# Altium footprint library can.PcbLib: 70 footprints (part 3 of 5)
Each footprint in its own frame and in the unit in brackets; x right, y up, seen from the top. Pads: shape width x height; smd on the part's side, far side on the other; paste and mask are expansions set on the pad; w line width, h text height; cw(c..) or ccw(c..) is an arc to the next point about the centre after c.
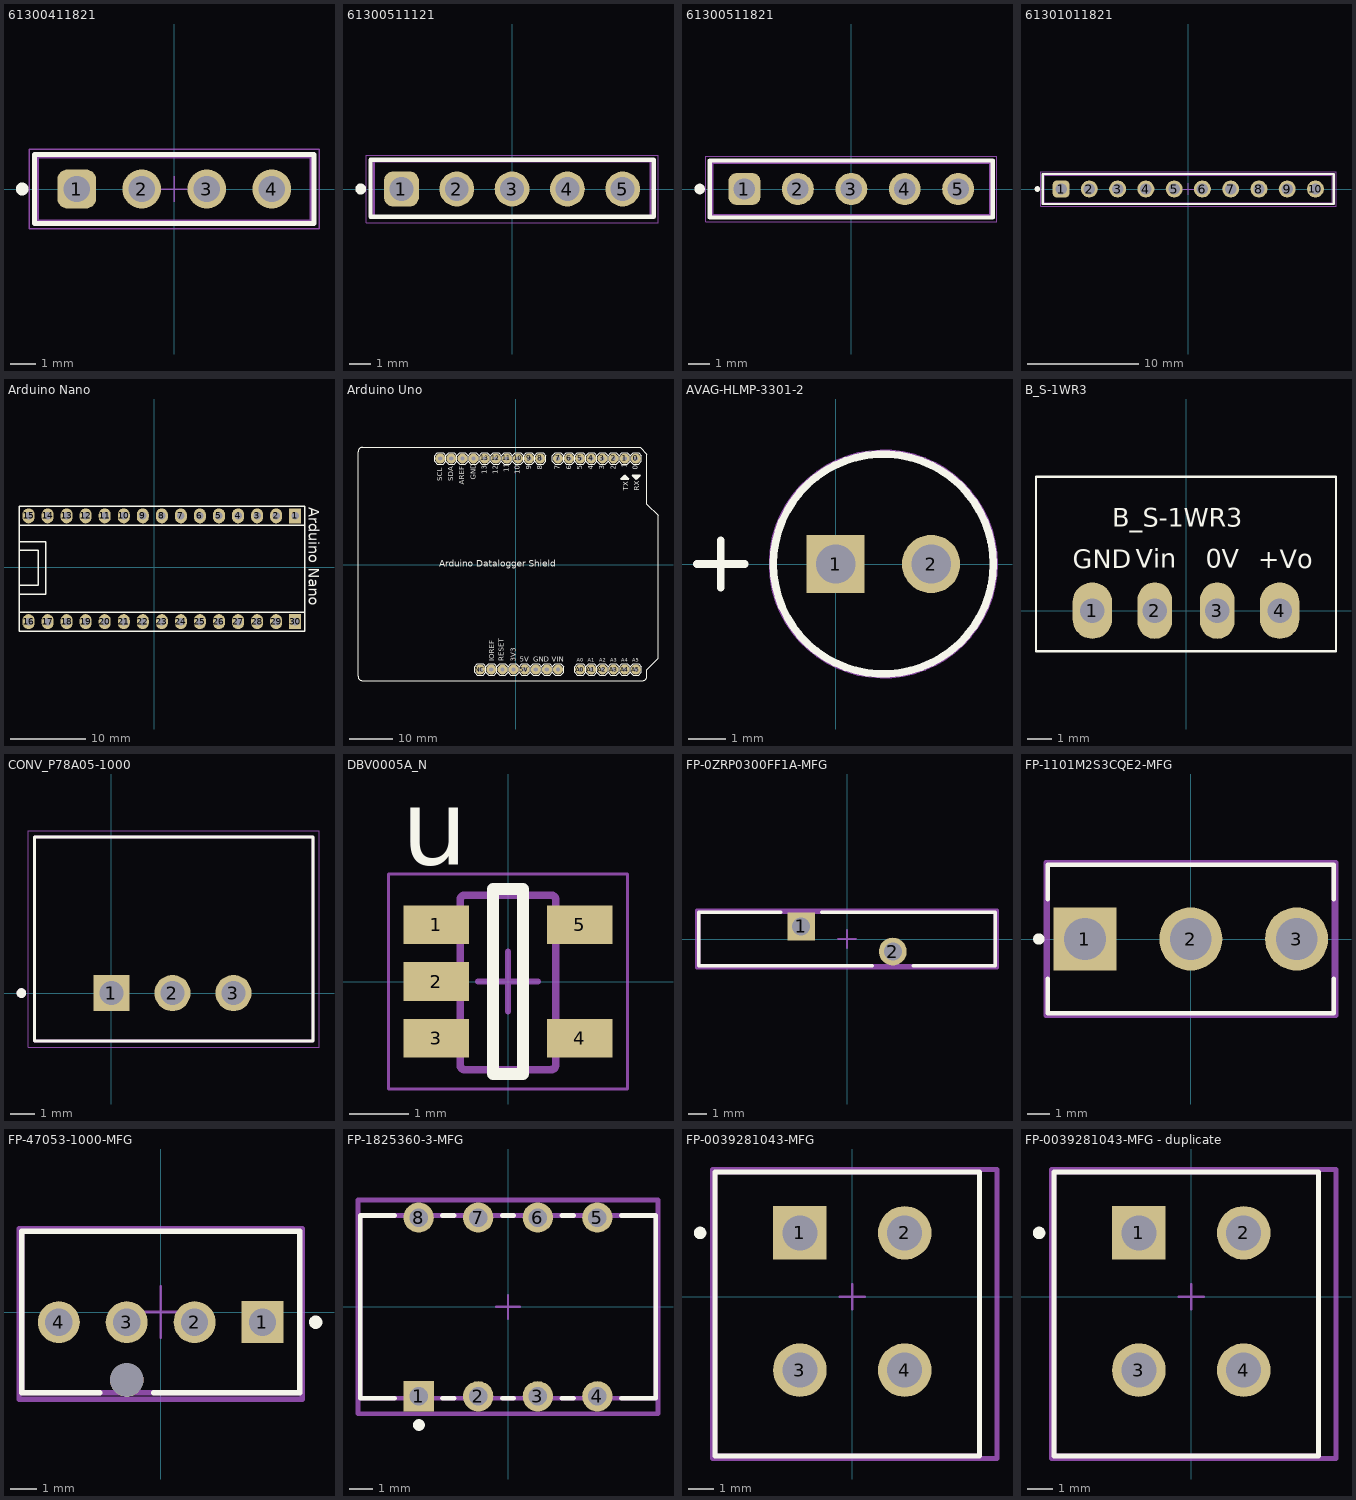
[diagram p2: the footprints below, top view; thin cyan lines are the x and y axes]

## 61300411821 [mm] "Socket Header, Pitch 2.54 mm, THT, Vertical, single row, 4p"
height 8.5
pads (4):
  rrect50% 1.52x1.52 hole 1.02: 1(-3.81,0)
  round 1.52 hole 1.02: 2(-1.27,0) 3(1.27,0) 4(3.81,0)
Top Overlay:
  circle w0.25: c-5.94,0 r0.125
  lines w0.2: -5.455,-1.35 -5.455,1.35 5.455,1.35 5.455,-1.35 -5.455,-1.35
Top Courtyard:
  lines w0.05: -5.655,-1.55 -5.655,1.55 5.655,1.55 5.655,-1.55 -5.655,-1.55
Top Designator:
  text ".Designator" at -7.498,-0.5 h1.5
Top Component Outline:
  lines w0.1: -5.33,-1.25 -5.33,1.25 5.33,1.25 5.33,-1.25 -5.33,-1.25
Top Component Center:
  lines w0.05: -0.5,0 0.5,0 ; 0,-0.5 0,0.5
3D body "61300411821.stp": height 8.55, standoff -3.05, extent -5.33,-1.25 5.33,1.25

## 61300511121 [mm] "Pin Header, pitch 2.54 mm, THT, Vertical, single row, 5p"
height 8.54
pads (5):
  rrect50% 1.6x1.6 hole 1.1: 1(-5.08,0)
  round 1.6 hole 1.1: 2(-2.54,0) 3(0,0) 4(2.54,0) 5(5.08,0)
Top Overlay:
  circle w0.25: c-6.95,0 r0.125
  lines w0.2: -6.5,-1.27 -6.5,1.345 6.5,1.345 6.5,-1.27 -6.5,-1.27
Top Courtyard:
  lines w0.05: -6.7,-1.545 -6.7,1.545 6.7,1.545 6.7,-1.545 -6.7,-1.545
Top Designator:
  text ".Designator" at -7.498,-0.5 h1.5
Top Component Outline:
  lines w0.1: -6.35,-1.27 6.35,-1.27 6.35,1.27 -6.35,1.27 -6.35,-1.27
Top Component Center:
  lines w0.05: -0.5,0 0.5,0 ; 0,-0.5 0,0.5
3D body "61300511121.stp": height 8.57, standoff -2.97, extent -6.35,-1.27 6.35,1.27

## 61300511821 [mm] "Socket Header, Pitch 2.54 mm, THT, Vertical, single row, 5p"
height 8.5
pads (5):
  rrect50% 1.52x1.52 hole 1.02: 1(-5.08,0)
  round 1.52 hole 1.02: 2(-2.54,0) 3(0,0) 4(2.54,0) 5(5.08,0)
Top Overlay:
  circle w0.25: c-7.21,0 r0.125
  lines w0.2: -6.725,-1.35 6.725,-1.35 6.725,1.35 -6.725,1.35 -6.725,-1.35
Top Courtyard:
  lines w0.05: -6.925,-1.55 6.925,-1.55 6.925,1.55 -6.925,1.55 -6.925,-1.55
Top Designator:
  text ".Designator" at -7.498,-0.5 h1.5
Top Component Outline:
  lines w0.1: -6.6,-1.25 6.6,-1.25 6.6,1.25 -6.6,1.25 -6.6,-1.25
Top Component Center:
  lines w0.05: -0.5,0 0.5,0 ; 0,-0.5 0,0.5
3D body "61300511821.stp": height 8.55, standoff -3.06, extent -6.6,-1.25 6.6,1.25

## 61301011821 [mm] "Socket Header, Pitch 2.54 mm, THT, Vertical, single row, 10p"
height 8.5
pads (10):
  rrect50% 1.52x1.52 hole 1.02: 1(-11.43,0)
  round 1.52 hole 1.02: 2(-8.89,0) 3(-6.35,0) 4(-3.81,0) 5(-1.27,0) 6(1.27,0) 7(3.81,0) 8(6.35,0) 9(8.89,0) 10(11.43,0)
Top Overlay:
  circle w0.25: c-13.56,0 r0.125
  lines w0.2: -13.075,-1.35 -13.075,1.35 13.075,1.35 13.075,-1.35 -13.075,-1.35
Top Courtyard:
  lines w0.05: -13.275,-1.55 -13.275,1.55 13.275,1.55 13.275,-1.55 -13.275,-1.55
Top Designator:
  text ".Designator" at -7.498,-0.5 h1.5
Top Component Outline:
  lines w0.1: -12.95,-1.25 -12.95,1.25 12.95,1.25 12.95,-1.25 -12.95,-1.25
Top Component Center:
  lines w0.05: -0.5,0 0.5,0 ; 0,-0.5 0,0.5
3D body "61301011821.stp": height 8.55, standoff -3.06, extent -12.95,-1.25 12.95,1.25

## Arduino Nano [mm]
pads (30):
  rect 1.6x2 hole 1: 1(18.796,6.858) 30(18.796,-7.239)
  oval 1.6x2 hole 1: 2(16.256,6.858) 3(13.716,6.858) 4(11.176,6.858) 5(8.636,6.858) 6(6.096,6.858) 7(3.556,6.858) 8(1.016,6.858) 9(-1.524,6.858) 10(-4.064,6.858) 11(-6.604,6.858) 12(-9.144,6.858) 13(-11.684,6.858) 14(-14.224,6.858) 15(-16.764,6.858) 16(-16.764,-7.239) 17(-14.224,-7.239) 18(-11.684,-7.239) 19(-9.144,-7.239) 20(-6.604,-7.239) 21(-4.064,-7.239) 22(-1.524,-7.239) 23(1.016,-7.239) 24(3.556,-7.239) 25(6.096,-7.239) 26(8.636,-7.239) 27(11.176,-7.239) 28(13.716,-7.239) 29(16.256,-7.239)
Top Overlay:
  lines w0.2: -18.034,-7.493 -18.034,6.858 ; -18.034,-3.429 -18.034,-3.556 -14.478,-3.556 -14.478,3.429 -18.034,3.429 ; -18.034,-2.413 -15.494,-2.413 -15.494,2.286 -18.034,2.286 ; 20.066,-8.128 20.066,8.001 ; -18.034,-8.509 18.161,-8.509 20.066,-8.509 20.066,-5.969 -18.034,-5.969 -18.034,-8.509 ; -18.034,5.588 18.161,5.588 20.066,5.588 20.066,8.128 -18.034,8.128 -18.034,5.588
  text "Arduino Nano" at 20.574,8.001 h1.4

## Arduino Uno [mm]
pads (32):
  round 2.3 hole 1: 0(27.44,24.26) 1(24.9,24.26) 2(22.36,24.26) 3(19.82,24.26) 3.3V(-0.5,-24) 4(17.28,24.26) 5(14.74,24.26) 5V(2.04,-24) 6(12.2,24.26) 7(9.66,24.26) 8(5.596,24.26) 9(3.056,24.26) 10(0.516,24.26) 11(-2.024,24.26) 12(-4.564,24.26) 13(-7.104,24.26) A0(14.74,-24) A1(17.28,-24) A2(19.82,-24) A3(22.36,-24) A4(24.9,-24) A5(27.44,-24) AREF(-12.184,24.26) GND1(7.12,-24) GND2(4.58,-24) GND3(-9.644,24.26) IOREF(-5.58,-24) NC(-8.12,-24) RST(-3.04,-24) SCL(-17.264,24.26) SDA(-14.724,24.26) Vin(9.66,-24)
Top Overlay:
  drawing of 255 lines, arcs and shapes, not listed
  text "Arduino Datalogger Shield" at -17.5,-0.5 h1.52
  text "SDA" at -14.271,19.087 h1.21
  text "SCL" at -16.8,19.1 h1.21
  text "0" at 27.887,21.676 h1.21
  text "1" at 25.347,22.079 h1.21
  text "2" at 22.807,21.676 h1.21
  text "3" at 20.267,21.676 h1.21
  text "4" at 17.727,21.676 h1.21
  text "5" at 15.187,21.676 h1.21
  text "6" at 12.647,21.676 h1.21
  text "7" at 10.107,21.676 h1.21
  text "8" at 6.043,21.676 h1.21
  text "9" at 3.503,21.676 h1.21
  text "10" at 0.963,20.669 h1.21
  text "11" at -1.577,21.072 h1.21
  text "12" at -4.117,20.669 h1.21
  text "13" at -6.657,20.669 h1.21
  text "RX" at 28.202,16.894 h1.21
  text "TX" at 25.662,16.919 h1.21
  text "IOREF" at -4.945,-22.095 h1.21
  text "GND" at 3.97,-22.222 h1.21
  text "VIN" at 8.263,-22.222 h1.21
  text "A5" at 26.653,-22.197 h0.86
  text "A4" at 24.113,-22.197 h0.86
  text "A3" at 21.573,-22.197 h0.86
  text "A2" at 19.033,-22.197 h0.86
  text "A1" at 16.493,-22.197 h0.86
  text "3V3" at 0.008,-22.222 h1.21
  text "RESET" at -2.786,-22.095 h1.21
  text "GND" at -9.172,19.386 h1.21
  text "AREF" at -11.814,18.203 h1.21
  text "A0" at 13.953,-22.197 h0.86
  text "5V" at 0.897,-22.222 h1.21

## AVAG-HLMP-3301-2 [mm] "THD, 2-Leads, Body Dia 5.85mm"
pads (2):
  rect 1.55x1.55 hole 1.05: 1(0,0)
  round 1.55 hole 1.05: 2(2.54,0)
Top Overlay:
  circle w0.2: c1.27,0 r2.923
  lines w0.2: -3.683,0 -2.413,0 ; -3.048,-0.635 -3.048,0.635
Mechanical 13:
  circle w0.1: c1.27,0 r2.923
Mechanical 15:
  circle w0.05: c1.27,0 r3.023

## B_S-1WR3 [mm] "Isolated DC-DC / 13.5 V - 16.5 V IN / 9 V OUT"
pads (4):
  oval 1.6x2.3 hole 1: 1(-3.81,0) 4(3.81,0)
  oval 1.4x2.3 hole 1: 2(-1.27,0) 3(1.27,0)
Top Overlay:
  lines w0.1: -6.1,-1.662 6.1,-1.662 6.1,5.45 -6.1,5.45 -6.1,-1.662
  text "GND" at -4.607,1.724 h0.76
  text "B_S-1WR3" at -3.006,3.418 h0.76
  text "Vin" at -2.034,1.731 h0.76
  text "+Vo" at 2.93,1.716 h0.76
  text "0V" at 0.808,1.734 h0.76
3D body "B-S-1WR3.stp": height 10.2, standoff -4.06, extent -5.814,-0.884 5.786,5.116

## CONV_P78A05-1000 [mm]
pads (3):
  rect 1.508x1.508 hole 1: 1(0,0)
  round 1.508 hole 1: 2(2.54,0) 3(5.08,0)
Top Overlay:
  circle w0.2: c-3.75,0 r0.1
  lines w0.127: -3.21,-2 -3.21,6.5 8.39,6.5 8.39,-2 -3.21,-2
Mechanical 13:
  circle w0.2: c-3.75,0 r0.1
  lines w0.127: -3.21,-2 8.39,-2 8.39,6.5 -3.21,6.5 -3.21,-2
Mechanical 15:
  lines w0.05: -3.46,-2.25 8.64,-2.25 8.64,6.75 -3.46,6.75 -3.46,-2.25

## DBV0005A_N [mm]
pads (5):
  rect 1.1x0.65 smd paste-0.102 mask+0.051: 1(-1.2,0.95) 2(-1.2,0) 3(-1.2,-0.95) 4(1.2,-0.95) 5(1.2,0.95)
Top Overlay:
  lines w0.2: -0.25,-1.55 0.25,-1.55 0.25,1.55 -0.25,1.55 -0.25,-1.55
  text "u" at -1.778,1.956 h1.27
Mechanical 13:
  lines w0.127: -0.801,1.371 cw(c-0.725,1.37) -0.725,1.446 ; -0.801,1.37 -0.801,-1.399 -0.801,-1.4 ccw(c-0.725,-1.399) -0.725,-1.475 ; -0.801,1.37 -0.801,1.371 ; -0.725,-1.475 -0.725,-1.475 ; -0.725,-1.475 0.723,-1.475 0.724,-1.475 ccw(c0.723,-1.399) 0.799,-1.4 0.799,-1.399 0.799,1.37 ; -0.725,1.446 0.723,1.446 0.724,1.446 cw(c0.723,1.37) 0.799,1.371 ; -0.725,1.446 -0.725,1.446 ; 0.799,1.37 0.799,1.371 ; -1.423,-1.167 -1.199,-1.167 -1.105,-1.167 -1.088,-1.167 -0.835,-1.167 -0.801,-1.167 -0.801,-0.767 -0.835,-0.767 -1.088,-0.767 -1.105,-0.767 -1.199,-0.767 -1.423,-0.767 -1.423,-1.167 ; -1.423,-0.215 -1.199,-0.215 -1.105,-0.215 -1.088,-0.215 -0.835,-0.215 -0.801,-0.215 -0.801,0.186 -0.835,0.186 -1.088,0.186 -1.105,0.186 -1.199,0.186 -1.423,0.186 -1.423,-0.215 ; -1.423,0.738 -1.199,0.738 -1.105,0.738 -1.088,0.738 -0.835,0.738 -0.801,0.738 -0.801,1.138 -0.835,1.138 -1.088,1.138 -1.105,1.138 -1.199,1.138 -1.423,1.138 -1.423,0.738 ; 0.799,-1.167 0.799,-0.767 0.834,-0.767 1.087,-0.767 1.103,-0.767 1.198,-0.767 1.422,-0.767 1.422,-1.167 1.198,-1.167 1.103,-1.167 1.087,-1.167 0.834,-1.167 0.799,-1.167 ; 0.799,0.738 0.799,1.138 0.834,1.138 1.087,1.138 1.103,1.138 1.198,1.138 1.422,1.138 1.422,0.738 1.198,0.738 1.103,0.738 1.087,0.738 0.834,0.738 0.799,0.738
Mechanical 15:
  lines w0.05: -2,-1.8 -2,1.8 2,1.8 2,-1.8 -2,-1.8
  lines w0.1: -0.5,0 0.5,0 ; 0,-0.5 0,0.5

## FP-0ZRP0300FF1A-MFG [mm]
pads (2):
  rect 1.55x1.55 hole 1 paste-2539.97 mask+0: 1(-2.55,0.7)
  round 1.55 hole 1 paste-2539.97 mask+0: 2(2.55,-0.7)
Top Overlay:
  lines w0.2: -3.7,1.5 -8.25,1.5 -8.25,-1.5 1.4,-1.5 ; -1.4,1.5 8.25,1.5 8.25,-1.5 3.7,-1.5
Top Courtyard:
  lines w0.2: -8.35,-1.6 8.35,-1.6 8.35,1.6 -8.35,1.6 -8.35,-1.6
Top 3D Body:
  lines w0.2: -8.25,-1.5 8.25,-1.5 8.25,1.5 -8.25,1.5 -8.25,-1.5
Top Assembly:
  lines w0.2: -8.35,-1.6 8.35,-1.6 8.35,1.6 -8.35,1.6 -8.35,-1.6
  text ".Designator" at 0,0.188 h1
Top Component Center:
  lines w0.1: -0.5,0 0.5,0 ; 0,-0.5 0,0.5
3D body "Fuse_Bel_Fuse_Inc_0ZRP0300FF1A_eec.STEP": height 0.25, standoff 0, extent -8.35,-1.6 8.35,1.6

## FP-1101M2S3CQE2-MFG [mm]
pads (3):
  rect 2.8x2.8 hole 1.85 paste-2539.97 mask+0: 1(-4.7,0)
  round 2.8 hole 1.85 paste-2539.97 mask+0: 2(0,0) 3(4.7,0)
Top Overlay:
  circle w0.25: c-6.75,0 r0.125
  lines w0.2: -6.35,-1.775 -6.35,-3.3 6.35,-3.3 6.35,-1.775 ; -6.35,1.775 -6.35,3.3 6.35,3.3 6.35,1.775
Top Courtyard:
  lines w0.2: -6.45,-3.4 6.45,-3.4 6.45,3.4 -6.45,3.4 -6.45,-3.4
Top 3D Body:
  lines w0.2: -6.35,-3.3 6.35,-3.3 6.35,3.3 -6.35,3.3 -6.35,-3.3
Top Assembly:
  lines w0.2: -6.45,-3.4 6.45,-3.4 6.45,3.4 -6.45,3.4 -6.45,-3.4
  text ".Designator" at 0,-0.001 h1
Top Component Center:
  lines w0.1: -0.5,0 0.5,0 ; 0,-0.5 0,0.5
3D body "Switch_C&K_1101M2S3CQE2_eec.STEP": height 0.25, standoff 0, extent -6.45,-3.4 6.45,3.4

## FP-47053-1000-MFG [mm]
pads (5):
  rect 1.57x1.57 hole 1.02 paste-2539.97 mask+0: 1(3.81,-0.38)
  round 1.57 hole 1.02 paste-2539.97 mask+0: 2(1.27,-0.38) 3(-1.27,-0.38) 4(-3.81,-0.38)
  round 1.25 hole 1.25 unplated paste-2539.97 mask+0: ""(-1.27,-2.54)
Top Overlay:
  circle w0.25: c5.8,-0.38 r0.125
  lines w0.2: -2.27,-3.02 -5.2,-3.02 -5.2,3.02 5.2,3.02 5.2,-3.02 -0.27,-3.02
Top Courtyard:
  lines w0.2: -5.3,-3.265 5.3,-3.265 5.3,3.12 -5.3,3.12 -5.3,-3.265
Top 3D Body:
  lines w0.2: -5.2,-3.02 5.2,-3.02 5.2,3.02 -5.2,3.02 -5.2,-3.02
Top Assembly:
  lines w0.2: -5.3,-3.265 5.3,-3.265 5.3,3.12 -5.3,3.12 -5.3,-3.265
  text ".Designator" at 0,-0.073 h1
Top Component Center:
  lines w0.1: -0.958,0 0.958,0 ; 0,-0.958 0,0.958
3D body "Conn_Molex_47053-1000_eec.STEP": height 0.25, standoff 0, extent -5.3,-3.265 5.3,3.12

## FP-1825360-3-MFG [mm]
pads (8):
  rect 1.29x1.29 hole 0.79 paste-2539.97 mask+0: 1(-3.81,-3.81)
  round 1.29 hole 0.79 paste-2539.97 mask+0: 2(-1.27,-3.81) 3(1.27,-3.81) 4(3.81,-3.81) 5(3.81,3.81) 6(1.27,3.81) 7(-1.27,3.81) 8(-3.81,3.81)
Top Overlay:
  circle w0.25: c-3.795,-5.035 r0.125
  lines w0.2: -4.83,-3.9 -6.295,-3.9 -6.295,3.9 -4.83,3.9 ; -2.79,-3.9 -2.29,-3.9 ; -2.79,3.9 -2.29,3.9 ; -0.25,-3.9 0.25,-3.9 ; -0.25,3.9 0.25,3.9 ; 2.29,-3.9 2.79,-3.9 ; 2.29,3.9 2.79,3.9 ; 4.83,-3.9 6.295,-3.9 6.295,3.9 4.83,3.9
Top Courtyard:
  lines w0.2: -6.395,-4.555 -6.395,4.555 6.395,4.555 6.395,-4.555 -6.395,-4.555
Top 3D Body:
  lines w0.2: -6.295,-3.9 -6.295,3.9 6.295,3.9 6.295,-3.9 -6.295,-3.9
Top Assembly:
  lines w0.2: -6.395,-4.555 -6.395,4.555 6.395,4.555 6.395,-4.555 -6.395,-4.555
  text ".Designator" at 0,-0.001 h1
Top Component Center:
  lines w0.1: -0.5,0 0.5,0 ; 0,-0.5 0,0.5
3D body "Switch_TE_Connectivity_1825360-3_eec.STEP": height 0.25, standoff 0, extent -6.395,-4.555 6.395,4.555

## FP-0039281043-MFG [mm]
pads (4):
  rect 2.15x2.15 hole 1.4 paste-2539.97 mask+0: 1(-2.1,2.55)
  round 2.15 hole 1.4 paste-2539.97 mask+0: 2(2.1,2.55) 3(-2.1,-2.95) 4(2.1,-2.95)
Top Overlay:
  circle w0.25: c-6.1,2.55 r0.125
  lines w0.2: -5.5,-6.4 -5.5,5 5.1,5 5.1,-6.4 -5.5,-6.4
Top Courtyard:
  lines w0.2: -5.6,-6.5 -5.6,5.1 5.8,5.1 5.8,-6.5 -5.6,-6.5
Top 3D Body:
  lines w0.2: -5.5,-6.4 -5.5,5 5.1,5 5.1,-6.4 -5.5,-6.4
Top Assembly:
  lines w0.2: -5.6,-6.5 -5.6,5.1 5.8,5.1 5.8,-6.5 -5.6,-6.5
  text ".Designator" at 0.1,-0.512 h1
Top Component Center:
  lines w0.1: -0.5,0 0.5,0 ; 0,-0.5 0,0.5
3D body "Conn_Molex_0039281043_eec.STEP": height 0.25, standoff 0, extent -5.6,-6.5 5.8,5.1

## FP-0039281043-MFG - duplicate [mm]
pads (4):
  rect 2.15x2.15 hole 1.4 paste-2539.97 mask+0: 1(-2.1,2.55)
  round 2.15 hole 1.4 paste-2539.97 mask+0: 2(2.1,2.55) 3(-2.1,-2.95) 4(2.1,-2.95)
Top Overlay:
  circle w0.25: c-6.1,2.55 r0.125
  lines w0.2: -5.5,-6.4 5.1,-6.4 5.1,5 -5.5,5 -5.5,-6.4
Top Courtyard:
  lines w0.2: -5.6,-6.5 5.8,-6.5 5.8,5.1 -5.6,5.1 -5.6,-6.5
Top 3D Body:
  lines w0.2: -5.5,-6.4 5.1,-6.4 5.1,5 -5.5,5 -5.5,-6.4
Top Assembly:
  lines w0.2: -5.6,-6.5 5.8,-6.5 5.8,5.1 -5.6,5.1 -5.6,-6.5
  text ".Designator" at 0.1,-0.512 h1
Top Component Center:
  lines w0.1: -0.5,0 0.5,0 ; 0,-0.5 0,0.5
3D body "Conn_Molex_0039281043_eec.STEP": height 0.25, standoff 0, extent -5.6,-6.5 5.8,5.1